# Altium footprint library AltiumLibraries.PcbLib: 247 footprints (part 10 of 16)
Each footprint in its own frame and in the unit in brackets; x right, y up, seen from the top. Pads: shape width x height; smd on the part's side, far side on the other; paste and mask are expansions set on the pad; w line width, h text height; cw(c..) or ccw(c..) is an arc to the next point about the centre after c.
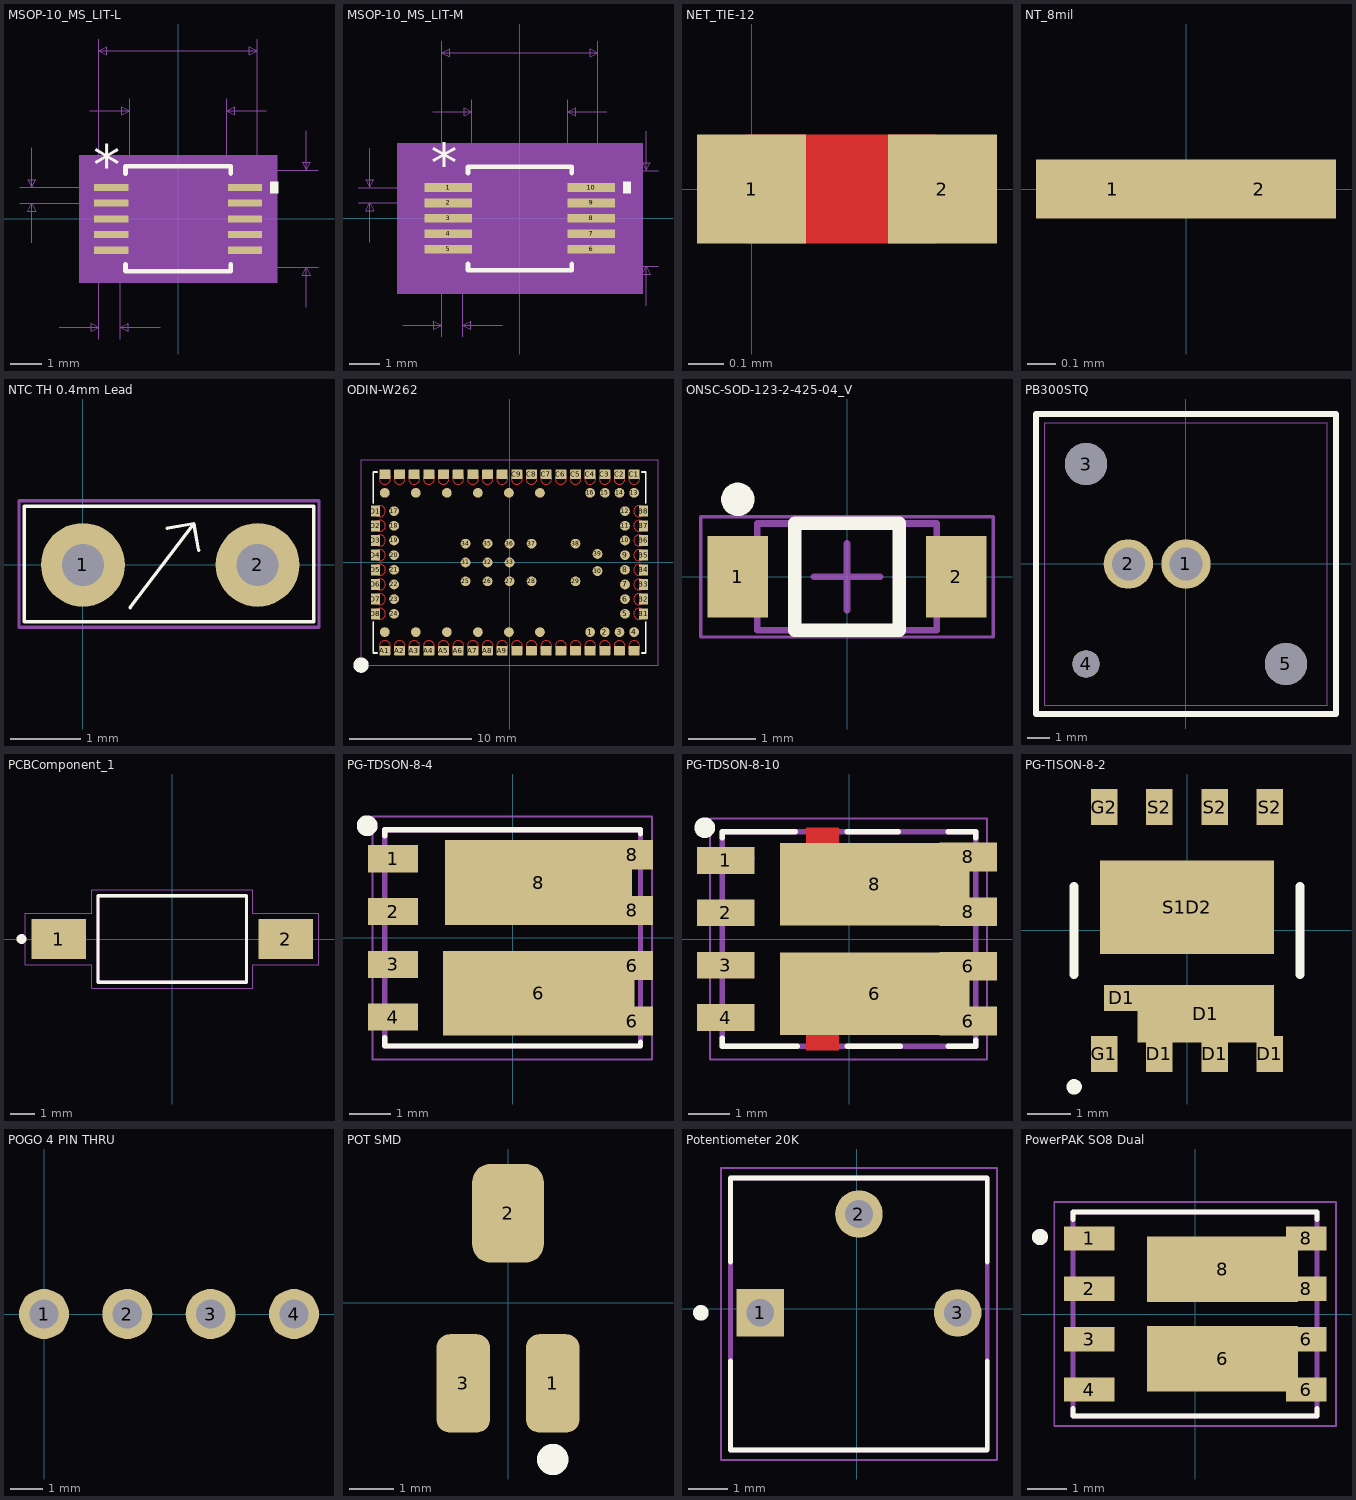
[diagram p9: the footprints below, top view; thin cyan lines are the x and y axes]

## MSOP-10_MS_LIT-L [mil]
pads (10):
  rect 43x9 smd paste+0 mask+0: 1(-84,39.4) 2(-84,19.7) 3(-84,0) 4(-84,-19.7) 5(-84,-39.4) 6(84,-39.4) 7(84,-19.7) 8(84,0) 9(84,19.7) 10(84,39.4)
Top Overlay:
  region: 115.5,46.9 125.5,46.9 125.5,31.9 115.5,31.9
  lines w6: -66,-57 -66,-66 66,-66 66,-57 ; -66,57 -66,66 66,66 66,57
  text "*" at -106.5,43.4 h50
Mechanical 5:
  region: 124.5,-80 -124.5,-80 -124.5,80 124.5,80
Mechanical 7:
  lines w1: -199,19.7 -84,19.7 ; -199,39.4 -84,39.4 ; -184,-30.3 -184,19.7 ; -184,89.4 -184,39.4 ; -149.5,-136 -99.5,-136 ; -111,136 -61,136 ; -99.5,-151 -99.5,0 -99.5,226 ; -72.5,-151 -72.5,0 ; -61,0 -61,151 ; -22.5,-136 -72.5,-136 ; 0,-61 176,-61 ; 0,61 176,61 ; 61,0 61,151 ; 99.5,0 99.5,226 ; 111,136 61,136 ; 161,-111 161,-61 ; 161,111 161,61 ; -184,19.7 -189,9.7 -179,9.7 -184,19.7 ; -184,39.4 -189,49.4 -179,49.4 -184,39.4 ; -99.5,-136 -109.5,-131 -109.5,-141 -99.5,-136 ; -99.5,211 99.5,211 ; -99.5,211 -89.5,216 -89.5,206 -99.5,211 ; -72.5,-136 -62.5,-131 -62.5,-141 -72.5,-136 ; -61,136 -71,141 -71,131 -61,136 ; 61,136 71,141 71,131 61,136 ; 99.5,211 89.5,216 89.5,206 99.5,211 ; 161,-61 156,-71 166,-71 161,-61 ; 161,61 156,71 166,71 161,61
  text "Default Padstyle: RX43Y9D0T" at -337.5,-261 h50
  text "Pin One Padstyle: RX43Y9D0T" at -337.5,-321 h50
  text "Alt 1 Padstyle: OX60Y90D30P" at -337.5,-501 h50
  text "Alt 2 Padstyle: OX90Y60D30P" at -337.5,-561 h50
  text "0.122in/3.099mm" at -93.75,156 h25
  text "0.199in/5.055mm" at -93.75,231 h25
  text "0.122in/3.099mm" at 181,-12.5 h25
  text "0.02in/0.5mm" at -354,17.05 h25
  text "0.027in/0.686mm" at -179.75,-181 h25
Mechanical 13:
  lines w0: -12,61 ccw(c0,61) 12,61
  lines w1: -99.5,-44.9 -99.5,-33.9 -61,-33.9 -61,-44.9 -99.5,-44.9 ; -99.5,-25.2 -99.5,-14.2 -61,-14.2 -61,-25.2 -99.5,-25.2 ; -99.5,-5.5 -99.5,5.5 -61,5.5 -61,-5.5 -99.5,-5.5 ; -99.5,14.2 -99.5,25.2 -61,25.2 -61,14.2 -99.5,14.2 ; -99.5,33.9 -99.5,44.9 -61,44.9 -61,33.9 -99.5,33.9 ; -61,-61 61,-61 61,61 -61,61 -61,-61 ; 61,-44.9 61,-33.9 99.5,-33.9 99.5,-44.9 61,-44.9 ; 61,-25.2 61,-14.2 99.5,-14.2 99.5,-25.2 61,-25.2 ; 61,-5.5 61,5.5 99.5,5.5 99.5,-5.5 61,-5.5 ; 61,14.2 61,25.2 99.5,25.2 99.5,14.2 61,14.2 ; 61,33.9 61,44.9 99.5,44.9 99.5,33.9 61,33.9
  text "*" at -58.5,8 h50
Mechanical 15:
  region: -65,-47.9 -109.5,-47.9 -109.5,47.9 -65,47.9 -65,65 65,65 65,47.9 109.5,47.9 109.5,-47.9 65,-47.9 65,-65 -65,-65
  lines w6: -109.5,-47.9 -109.5,47.9 -65,47.9 -65,65 65,65 65,47.9 109.5,47.9 109.5,-47.9 65,-47.9 65,-65 -65,-65 -65,-47.9 -109.5,-47.9
3D body "msop-10.SLDPRT": height 39.87, standoff -5.41, extent -96.46,-59.06 96.46,59.06

## MSOP-10_MS_LIT-M [mil]
pads (10):
  rect 60.5x11 smd paste+0 mask+0: 1(-91.25,39.4) 2(-91.25,19.7) 3(-91.25,0) 4(-91.25,-19.7) 5(-91.25,-39.4) 6(91.25,-39.4) 7(91.25,-19.7) 8(91.25,0) 9(91.25,19.7) 10(91.25,39.4)
Top Overlay:
  region: 131.5,46.9 141.5,46.9 141.5,31.9 131.5,31.9
  lines w6: -66,-58 -66,-66 66,-66 66,-58 ; -66,58 -66,66 66,66 66,58
  text "*" at -113.75,45.4 h50
Mechanical 5:
  region: 156.5,-96 -156.5,-96 -156.5,96 156.5,96
Mechanical 7:
  lines w1: -206.25,19.7 -91.25,19.7 ; -206.25,39.4 -91.25,39.4 ; -191.25,-30.3 -191.25,19.7 ; -191.25,89.4 -191.25,39.4 ; -149.5,-136 -99.5,-136 ; -111,136 -61,136 ; -99.5,-151 -99.5,0 -99.5,226 ; -72.5,-151 -72.5,0 ; -61,0 -61,151 ; -22.5,-136 -72.5,-136 ; 0,-61 176,-61 ; 0,61 176,61 ; 61,0 61,151 ; 99.5,0 99.5,226 ; 111,136 61,136 ; 161,-111 161,-61 ; 161,111 161,61 ; -191.25,19.7 -186.25,9.7 -196.25,9.7 -191.25,19.7 ; -191.25,39.4 -186.25,49.4 -196.25,49.4 -191.25,39.4 ; -99.5,-136 -109.5,-141 -109.5,-131 -99.5,-136 ; -99.5,211 -89.5,206 -89.5,216 -99.5,211 ; -99.5,211 99.5,211 ; -72.5,-136 -62.5,-141 -62.5,-131 -72.5,-136 ; -61,136 -71,131 -71,141 -61,136 ; 61,136 71,131 71,141 61,136 ; 99.5,211 89.5,206 89.5,216 99.5,211 ; 161,-61 166,-71 156,-71 161,-61 ; 161,61 166,71 156,71 161,61
  text "0.027in/0.686mm" at -179.75,-181 h25
  text "0.02in/0.5mm" at -361.25,17.05 h25
  text "0.122in/3.099mm" at 181,-12.5 h25
  text "0.199in/5.055mm" at -93.75,231 h25
  text "0.122in/3.099mm" at -93.75,156 h25
  text "Alt 2 Padstyle: OX90Y60D30P" at -337.5,-561 h50
  text "Alt 1 Padstyle: OX60Y90D30P" at -337.5,-501 h50
  text "Pin One Padstyle: RX60p5Y11D0T" at -375,-321 h50
  text "Default Padstyle: RX60p5Y11D0T" at -375,-261 h50
Mechanical 13:
  lines w0: -12,61 ccw(c0,61) 12,61
  lines w1: -99.5,-44.9 -61,-44.9 -61,-33.9 -99.5,-33.9 -99.5,-44.9 ; -99.5,-25.2 -61,-25.2 -61,-14.2 -99.5,-14.2 -99.5,-25.2 ; -99.5,-5.5 -61,-5.5 -61,5.5 -99.5,5.5 -99.5,-5.5 ; -99.5,14.2 -61,14.2 -61,25.2 -99.5,25.2 -99.5,14.2 ; -99.5,33.9 -61,33.9 -61,44.9 -99.5,44.9 -99.5,33.9 ; -61,-61 -61,61 61,61 61,-61 -61,-61 ; 61,-44.9 99.5,-44.9 99.5,-33.9 61,-33.9 61,-44.9 ; 61,-25.2 99.5,-25.2 99.5,-14.2 61,-14.2 61,-25.2 ; 61,-5.5 99.5,-5.5 99.5,5.5 61,5.5 61,-5.5 ; 61,14.2 99.5,14.2 99.5,25.2 61,25.2 61,14.2 ; 61,33.9 99.5,33.9 99.5,44.9 61,44.9 61,33.9
  text "*" at -58.5,8 h50
Mechanical 15:
  region: -81,-64.9 -141.5,-64.9 -141.5,64.9 -81,64.9 -81,81 81,81 81,64.9 141.5,64.9 141.5,-64.9 81,-64.9 81,-81 -81,-81
  lines w6: -141.5,-64.9 -81,-64.9 -81,-81 81,-81 81,-64.9 141.5,-64.9 141.5,64.9 81,64.9 81,81 -81,81 -81,64.9 -141.5,64.9 -141.5,-64.9
3D body "msop-10.SLDPRT": height 39.87, standoff -5.4, extent -96.46,-59.06 96.46,59.06

## NET_TIE-12 [mil] "12mil patch for net tie."
pads (2):
  rect 12x12 smd paste-12: 1(0,0) 2(21,0)
Top Layer:
  lines w12: 0,0 19.68,0

## NT_8mil [mil] "8mil wide nettie"
pads (2):
  rect 21x8 smd paste+0 mask+0: 1(-10,0) 2(10,0)

## NTC TH 0.4mm Lead [mm] "0.4mm Lead, 2.5mm Spacing"
pads (2):
  round 1.2 hole 0.6: 1(0,0) 2(2.5,0)
Top Overlay:
  lines w0.05: 0.676,-0.61 1.587,0.592 ; 1.206,0.525 1.587,0.592 ; 1.654,0.211 1.587,0.592 ; -0.838,-0.813 -0.838,0.838 3.302,0.838 3.302,-0.813 -0.838,-0.813
Mechanical 15:
  lines w0.05: -0.914,-0.889 -0.914,0.914 3.378,0.914 3.378,-0.889 -0.914,-0.889

## ODIN-W262 [mm]
pads (103):
  round 0.8 smd: 1(6.6,-5.7) 2(7.8,-5.7) 3(9,-5.7) 4(10.2,-5.7) 5(9.45,-4.2) 6(9.45,-3) 7(9.45,-1.8) 8(9.45,-0.6) 9(9.45,0.6) 10(9.45,1.8) 11(9.45,3) 12(9.45,4.2) 13(10.2,5.7) 14(9,5.7) 15(7.8,5.7) 16(6.6,5.7) 17(-9.45,4.2) 18(-9.45,3) 19(-9.45,1.8) 20(-9.45,0.6) 21(-9.45,-0.6) 22(-9.45,-1.8) 23(-9.45,-3) 24(-9.45,-4.2) 25(-3.6,-1.54) 26(-1.8,-1.54) 27(0,-1.54) 28(1.8,-1.54) 29(5.4,-1.54) 30(7.2,-0.7) 31(-3.6,0) 32(-1.8,0) 33(0,0) 34(-3.6,1.54) 35(-1.8,1.54) 36(0,1.54) 37(1.8,1.54) 38(5.4,1.54) 39(7.2,0.7) TP1(2.49,-5.7) TP2(2.49,5.7) TP3(-0.05,-5.7) TP4(-0.05,5.7) TP5(-2.59,-5.7) TP6(-2.59,5.7) TP7(-5.13,-5.7) TP8(-5.13,5.7) TP9(-7.67,-5.7) TP10(-7.67,5.7) TP11(-10.21,-5.7) TP12(-10.21,5.7)
  rrect15% 0.9x0.75 smd paste-1 mask+0: A1(-10.2,-7.225) A2(-9,-7.225) A3(-7.8,-7.225) A4(-6.6,-7.225) A5(-5.4,-7.225) A6(-4.2,-7.225) A7(-3,-7.225) A8(-1.8,-7.225) A9(-0.6,-7.225) A10(0.6,-7.225) A11(1.8,-7.225) A12(3,-7.225) A13(4.2,-7.225) A14(5.4,-7.225) A15(6.6,-7.225) A16(7.8,-7.225) A17(9,-7.225) A18(10.2,-7.225) C1(10.2,7.225) C2(9,7.225) C3(7.8,7.225) C4(6.6,7.225) C5(5.4,7.225) C6(4.2,7.225) C7(3,7.225) C8(1.8,7.225) C9(0.6,7.225) C10(-0.6,7.225) C11(-1.8,7.225) C12(-3,7.225) C13(-4.2,7.225) C14(-5.4,7.225) C15(-6.6,7.225) C16(-7.8,7.225) C17(-9,7.225) C18(-10.2,7.225)
  rrect15% 0.75x0.9 smd paste-1 mask+0: B1(10.975,-4.2) B2(10.975,-3) B3(10.975,-1.8) B4(10.975,-0.6) B5(10.975,0.6) B6(10.975,1.8) B7(10.975,3) B8(10.975,4.2) D1(-10.975,4.2) D2(-10.975,3) D3(-10.975,1.8) D4(-10.975,0.6) D5(-10.975,-0.6) D6(-10.975,-1.8) D7(-10.975,-3) D8(-10.975,-4.2)
Top Layer:
  circle w0: c10.6,4.2 r0.45
  circle w0: c10.6,3 r0.45
  circle w0: c10.6,1.8 r0.45
  circle w0: c10.6,0.6 r0.45
  circle w0: c10.6,-0.6 r0.45
  circle w0: c10.6,-1.8 r0.45
  circle w0: c10.6,-3 r0.45
  circle w0: c10.6,-4.2 r0.45
  circle w0: c-10.6,-4.2 r0.45
  circle w0: c-10.6,-3 r0.45
  circle w0: c-10.6,-1.8 r0.45
  circle w0: c-10.6,-0.6 r0.45
  circle w0: c-10.6,0.6 r0.45
  circle w0: c-10.6,1.8 r0.45
  circle w0: c-10.6,3 r0.45
  circle w0: c-10.6,4.2 r0.45
  circle w0: c4.2,6.85 r0.45
  circle w0: c5.4,6.85 r0.45
  circle w0: c6.6,6.85 r0.45
  circle w0: c7.8,6.85 r0.45
  circle w0: c9,6.85 r0.45
  circle w0: c10.2,6.85 r0.45
  circle w0: c-10.2,6.85 r0.45
  circle w0: c-9,6.85 r0.45
  circle w0: c-7.8,6.85 r0.45
  circle w0: c-6.6,6.85 r0.45
  circle w0: c-5.4,6.85 r0.45
  circle w0: c-4.2,6.85 r0.45
  circle w0: c-3,6.85 r0.45
  circle w0: c-1.8,6.85 r0.45
  circle w0: c-0.6,6.85 r0.45
  circle w0: c0.6,6.85 r0.45
  circle w0: c1.8,6.85 r0.45
  circle w0: c3,6.85 r0.45
  circle w0: c-4.2,-6.85 r0.45
  circle w0: c-5.4,-6.85 r0.45
  circle w0: c-6.6,-6.85 r0.45
  circle w0: c-7.8,-6.85 r0.45
  circle w0: c-9,-6.85 r0.45
  circle w0: c-10.2,-6.85 r0.45
  circle w0: c10.2,-6.85 r0.45
  circle w0: c9,-6.85 r0.45
  circle w0: c7.8,-6.85 r0.45
  circle w0: c6.6,-6.85 r0.45
  circle w0: c5.4,-6.85 r0.45
  circle w0: c4.2,-6.85 r0.45
  circle w0: c3,-6.85 r0.45
  circle w0: c1.8,-6.85 r0.45
  circle w0: c0.6,-6.85 r0.45
  circle w0: c-0.6,-6.85 r0.45
  circle w0: c-1.8,-6.85 r0.45
  circle w0: c-3,-6.85 r0.45
Top Overlay:
  circle w0.75: c-12.15,-8.4 r0.25
  lines w0.15: -11.15,-4.85 -11.15,-7.4 -10.85,-7.4 ; -11.15,4.85 -11.15,7.4 -10.85,7.4 ; 10.85,-7.4 11.15,-7.4 11.15,-4.85 ; 10.85,7.4 11.15,7.4 11.15,4.85
Top Paste:
  drawing of 52 lines, arcs and shapes, not listed
Top Solder:
  drawing of 56 lines, arcs and shapes, not listed
Mechanical 13:
  lines w0.05: -0.5,0 0.5,0 ; 0,-0.5 0,0.5
Mechanical 15:
  lines w0.1: -12.15,-8.4 12.15,-8.4 12.15,8.4 -12.15,8.4 -12.15,-8.4
3D body "ODIN-W262-05B.stp": height 4.8, standoff 0, extent -11.15,-7.4 11.15,7.4

## ONSC-SOD-123-2-425-04_V [mm] "SOD, 2-Leads, Body 2.69x1.6mm"
height 1.35
pads (2):
  rect 0.91x1.22 smd: 1(-1.635,0) 2(1.635,0)
Top Overlay:
  circle w0.25: c-1.635,1.16 r0.125
  lines w0.2: -0.78,-0.8 0.78,-0.8 0.78,0.8 -0.78,0.8 -0.78,-0.8
Mechanical 13:
  lines w0.1: -1.345,-0.8 1.345,-0.8 1.345,0.8 -1.345,0.8 -1.345,-0.8
Mechanical 15:
  lines w0.05: -2.19,-0.9 2.19,-0.9 2.19,0.9 -2.19,0.9 -2.19,-0.9
  lines w0.1: -0.5,0 0.5,0 ; 0,-0.5 0,0.5
3D body: height 1.35, standoff 0, extent -1.345,-0.8 1.345,0.8

## PB300STQ [mm] "SWITCH PUSH SPST-NO 0.3A 28V"
pads (5):
  round 2.175 hole 1.45: 1(0,0) 2(-2.54,0)
  round 1.86 hole 1.86 unplated: 3(-4.4,4.4) 5(4.4,-4.4)
  round 1.2 hole 1.2 unplated: 4(-4.4,-4.4)
Top Overlay:
  lines w0.254: -6.604,-6.604 6.604,-6.604 6.604,6.604 -6.604,6.604 -6.604,-6.604
Mechanical 15:
  lines w0.051: -6.223,-6.223 6.223,-6.223 6.223,6.223 -6.223,6.223 -6.223,-6.223
3D body "PB300STQ.stp": height 10.35, standoff -3.25, extent -6.2,-6.2 6.2,6.2

## PCBComponent_1 [mm]
pads (2):
  rect 2.19x1.6 smd: 1(-4.59,0) 2(4.59,0)
Top Overlay:
  circle w0.2: c-6.096,0 r0.1
  lines w0.127: -3,-1.75 -3,1.75 3,1.75 3,-1.75 -3,-1.75
Mechanical 13:
  lines w0.127: -3,-1.75 -3,1.75 3,1.75 3,-1.75 -3,-1.75
Mechanical 15:
  lines w0.05: -5.935,-1.05 -3.25,-1.05 -3.25,-2 3.25,-2 3.25,-1.05 5.935,-1.05 5.935,1.05 3.25,1.05 3.25,2 -3.25,2 -3.25,1.05 -5.935,1.05 -5.935,-1.05

## PG-TDSON-8-4 [mm] "Infineon specific mosfet array footprint"
pads (10):
  rect 1.2x0.65 smd paste-0.1: 1(-2.875,1.905) 2(-2.875,0.635) 3(-2.875,-0.635) 4(-2.875,-1.905)
  rect 4.6x2.035 smd paste-3: 6(0.625,-1.332)
  rect 1x0.7 smd paste-0.1: 6(2.875,-2) 6(2.875,-0.665) 8(2.875,0.665) 8(2.875,2)
  rect 4.5x2.035 smd paste-3: 8(0.625,1.332)
Top Overlay:
  circle w0.3: c-3.5,2.7 r0.1
  lines w0.127: -3.075,-2.4 -3.075,-2.6 3.075,-2.6 3.075,-2.5 ; -3.075,2.45 -3.075,2.6 3.075,2.6 3.075,2.5
Top Paste:
  rectangle: -0.916,1.553 -0.316,2.153
  rectangle: -0.916,0.553 -0.316,1.153
  rectangle: 1.284,0.553 1.884,1.153
  rectangle: 0.184,0.553 0.784,1.153
  rectangle: 0.184,1.553 0.784,2.153
  rectangle: 1.284,1.553 1.884,2.153
  rectangle: -0.9,-1.1 -0.3,-0.5
  rectangle: -0.9,-2.1 -0.3,-1.5
  rectangle: 1.3,-2.1 1.9,-1.5
  rectangle: 0.2,-2.1 0.8,-1.5
  rectangle: 0.2,-1.1 0.8,-0.5
  rectangle: 1.3,-1.1 1.9,-0.5
Mechanical 4:
  circle w0.3: c-2.55,1.95 r0.1
  circle w0.3: c-2.55,1.95 r0.1
  lines w0.127: -3.075,-2.6 -3.075,2.6 ; -3.075,-2.6 3.075,-2.6 ; -3.075,-2.6 -3.075,2.6 ; -3.075,-2.6 3.075,-2.6 ; -3.075,2.6 3.075,2.6 ; -3.075,2.6 3.075,2.6 ; 3.075,-2.6 3.075,2.6 ; 3.075,-2.6 3.075,2.6
Mechanical 16:
  lines w0.05: -3.375,-2.925 3.35,-2.925 3.35,2.925 -3.375,2.925 -3.375,-2.925
3D body "TDSON-8-4.STEP": height 1.01, standoff 0, extent -3.125,-2.695 3.025,2.695

## PG-TDSON-8-10 [mm] "Infineon specific mosfet array footprint"
pads (10):
  rect 1.4x0.65 smd paste-0.1: 1(-2.99,1.905) 2(-2.99,0.635) 3(-2.99,-0.635) 4(-2.99,-1.905)
  rect 4.6x2 smd paste-3: 6(0.625,-1.325) 8(0.625,1.325)
  rect 1.4x0.7 smd paste-0.1: 6(2.89,-1.99) 6(2.89,-0.66) 8(2.89,0.66) 8(2.89,1.99)
Top Layer:
  rectangle: -1.04,2.1 -0.25,2.7
  rectangle: -1.04,-2.7 -0.25,-2.1
Top Overlay:
  circle w0.3: c-3.5,2.7 r0.1
  lines w0.127: -3.075,-2.4 -3.075,-2.6 -1.25,-2.6 ; -3.075,2.45 -3.075,2.6 -1.3,2.6 ; -0.05,-2.6 1.25,-2.6 ; -0.05,2.6 1.2,2.6 ; 2.4,-2.6 3.075,-2.6 3.075,-2.45 ; 2.4,2.6 3.075,2.6 3.075,2.45
Top Paste:
  rectangle: -0.916,1.553 -0.316,2.153
  rectangle: -0.916,0.553 -0.316,1.153
  rectangle: 1.284,0.553 1.884,1.153
  rectangle: 0.184,0.553 0.784,1.153
  rectangle: 0.184,1.553 0.784,2.153
  rectangle: 1.284,1.553 1.884,2.153
  rectangle: -0.9,-1.1 -0.3,-0.5
  rectangle: -0.9,-2.1 -0.3,-1.5
  rectangle: 1.3,-2.1 1.9,-1.5
  rectangle: 0.2,-2.1 0.8,-1.5
  rectangle: 0.2,-1.1 0.8,-0.5
  rectangle: 1.3,-1.1 1.9,-0.5
Top Solder:
  region: -1.101,-2.25 -0.2,-2.25 -0.2,-2.752 -1.101,-2.752
  region: -1.101,2.75 -0.2,2.75 -0.2,2.253 -1.101,2.253
Mechanical 4:
  circle w0.3: c-2.55,1.95 r0.1
  circle w0.3: c-2.55,1.95 r0.1
  lines w0.127: -3.075,-2.6 -3.075,2.6 ; -3.075,-2.6 3.075,-2.6 ; -3.075,-2.6 -3.075,2.6 ; -3.075,-2.6 3.075,-2.6 ; -3.075,2.6 3.075,2.6 ; -3.075,2.6 3.075,2.6 ; 3.075,-2.6 3.075,2.6 ; 3.075,-2.6 3.075,2.6
Mechanical 16:
  lines w0.05: -3.375,-2.925 -3.375,2.925 3.35,2.925 3.35,-2.925 -3.375,-2.925
3D body "8-POWERSMD.STEP": height 1.1, standoff 0, extent -3.075,-2.575 3.075,2.575

## PG-TISON-8-2 [mm] "Infineon TISON Dual Mosfet Merged S1D2"
pads (11):
  rect 0.83x0.6 smd paste-0.1: D1(-1.5,-1.555)
  rect 0.61x0.83 smd: D1(-0.635,-2.84) D1(0.635,-2.84) D1(1.905,-2.84) G1(-1.905,-2.84) G2(-1.905,2.84) S2(-0.635,2.84) S2(0.635,2.84) S2(1.905,2.84)
  rect 3.14x1.32 smd paste-0.3: D1(0.43,-1.915)
  rect 4x2.15 smd paste-0.3: S1D2(0,0.53)
Top Overlay:
  circle w0.254: c-2.6,-3.6 r0.05
  lines w0.203: -2.6,-1.016 -2.6,1.016 ; 2.6,-1.016 2.6,1.016
3D body "User Library-TISON8.STEP": height 1.03, standoff -0.01, extent -2.51,-3.01 2.51,3.01

## POGO 4 PIN THRU [mil]
pads (4):
  round 60 hole 35.04: 1(0,0) 2(100,0) 3(200,0) 4(300,0)

## POT SMD [mm] "SMD Potentiometer NIDEC ST32EB"
pads (3):
  rrect50% 1.2x2.2 smd: 1(1,-1.8) 3(-1,-1.8)
  rrect50% 1.6x2.2 smd: 2(0,2)
Top Overlay:
  circle w0.5: c1,-3.5 r0.1
3D body "ST-32ETB200_(22).stp": height 2, standoff 0, extent -1.7,-2.2 1.7,2.2

## Potentiometer 20K [mm]
pads (3):
  rect 1.222x1.222 hole 0.714: 1(-2.48,-0.1)
  round 1.222 hole 0.714: 2(0.06,2.44) 3(2.6,-0.1)
Top Overlay:
  circle w0.2: c-4.004,-0.1 r0.1
  lines w0.127: -3.24,-3.63 3.36,-3.63 ; -3.24,-3.62 -3.24,-1.335 ; -3.24,1.205 -3.24,3.37 3.36,3.37 3.36,1.205 ; 3.36,-3.62 3.36,-1.335
Mechanical 4:
  lines w0.127: -3.24,-3.63 -3.24,3.37 ; -3.24,-3.63 3.36,-3.63 ; -3.24,-3.63 -3.24,3.37 ; -3.24,-3.63 3.36,-3.63 ; -3.24,3.37 3.36,3.37 ; -3.24,3.37 3.36,3.37 ; 3.36,-3.63 3.36,3.37 ; 3.36,-3.63 3.36,3.37
Mechanical 16:
  lines w0.05: -3.49,-3.88 -3.49,3.62 3.61,3.62 3.61,-3.88 -3.49,-3.88

## PowerPAK SO8 Dual [mm]
pads (10):
  rect 1.27x0.61 smd: 1(-2.67,1.905) 2(-2.67,0.635) 3(-2.67,-0.635) 4(-2.67,-1.905)
  rect 3.81x1.65 smd: 6(0.69,-1.13) 8(0.69,1.13)
  rect 1.02x0.61 smd: 6(2.795,-1.905) 6(2.795,-0.635) 8(2.795,0.635) 8(2.795,1.905)
Top Overlay:
  circle w0.2: c-3.91,1.94 r0.1
  lines w0.127: -3.075,-2.38 -3.075,-2.575 3.075,-2.575 3.075,-2.38 ; -3.075,2.38 -3.075,2.575 3.075,2.575 3.075,2.38
Mechanical 13:
  circle w0.2: c-3.91,1.94 r0.1
  lines w0.127: -3.075,-2.575 -3.075,2.575 3.075,2.575 3.075,-2.575 -3.075,-2.575
Mechanical 15:
  lines w0.05: -3.55,-2.825 -3.55,2.825 3.55,2.825 3.55,-2.825 -3.55,-2.825
3D body "SI7540DP-T1-GE3.STEP": height 1.12, standoff 0, extent -3.075,-2.581 3.072,2.575